# Altium footprint library 16-PCBa Modl.PcbLib: 81 footprints (part 4 of 6)
Each footprint in its own frame and in the unit in brackets; x right, y up, seen from the top. Pads: shape width x height; smd on the part's side, far side on the other; paste and mask are expansions set on the pad; w line width, h text height; cw(c..) or ccw(c..) is an arc to the next point about the centre after c.
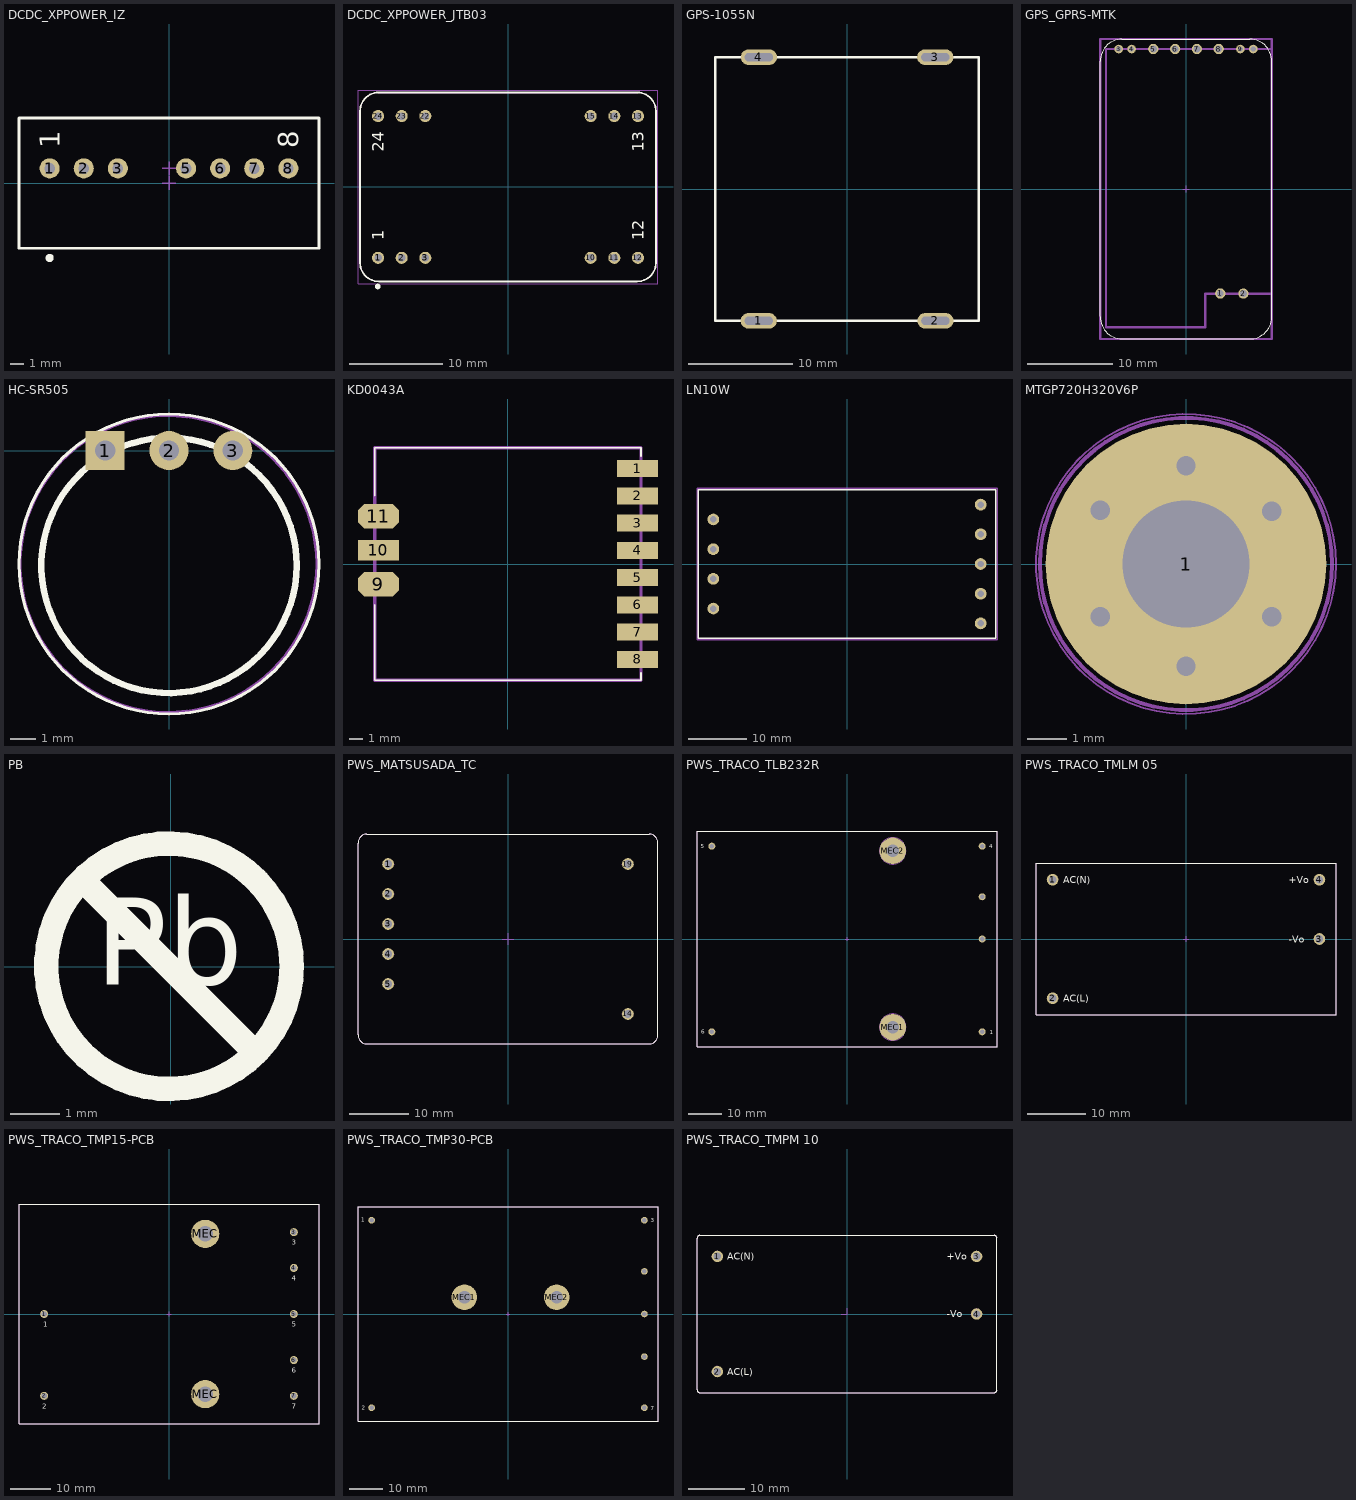
[diagram p3: the footprints below, top view; thin cyan lines are the x and y axes]

## DCDC_XPPOWER_IZ [mm] "SIP-8 Package DC-DC Converter,Body 21.85x11.1mm, IZ Serie"
height 11.6
pads (7):
  round 1.5 hole 0.8: 1(-8.89,1.1) 2(-6.35,1.1) 3(-3.81,1.1) 5(1.27,1.1) 6(3.81,1.1) 7(6.35,1.1) 8(8.89,1.1)
Top Overlay:
  circle w0.3: c-8.89,-5.567 r0.15
  lines w0.2: -11.175,-4.85 -11.175,4.85 11.175,4.85 11.175,-4.85 -11.175,-4.85
  text "8" at 9.64,2.6 h1.5
  text "1" at -8.14,2.6 h1.5
Mechanical 8:
  lines w0.1: -9.39,1.1 -8.89,1.1 ; -8.89,0.6 -8.89,1.1 ; -8.89,1.6 -8.89,1.1 ; -8.39,1.1 -8.89,1.1 ; -6.85,1.1 -6.35,1.1 ; -6.35,0.6 -6.35,1.1 ; -6.35,1.6 -6.35,1.1 ; -5.85,1.1 -6.35,1.1 ; -4.31,1.1 -3.81,1.1 ; -3.81,0.6 -3.81,1.1 ; -3.81,1.6 -3.81,1.1 ; -3.31,1.1 -3.81,1.1 ; -0.5,0 0,0 ; -0.5,1.1 0,1.1 ; 0,-0.5 0,0 ; 0,0.5 0,0 ; 0,0.6 0,1.1 ; 0,1.6 0,1.1 ; 0.5,0 0,0 ; 0.5,1.1 0,1.1 ; 0.77,1.1 1.27,1.1 ; 1.27,0.6 1.27,1.1 ; 1.27,1.6 1.27,1.1 ; 1.77,1.1 1.27,1.1 ; 3.31,1.1 3.81,1.1 ; 3.81,0.6 3.81,1.1 ; 3.81,1.6 3.81,1.1 ; 4.31,1.1 3.81,1.1 ; 5.85,1.1 6.35,1.1 ; 6.35,0.6 6.35,1.1 ; 6.35,1.6 6.35,1.1 ; 6.85,1.1 6.35,1.1 ; 8.39,1.1 8.89,1.1 ; 8.89,0.6 8.89,1.1 ; 8.89,1.6 8.89,1.1 ; 9.39,1.1 8.89,1.1
  text "2" at -5.6,2.6 h1.5
  text "3" at -3.06,2.6 h1.5
  text "5" at 2.02,2.6 h1.5
  text "6" at 4.56,2.6 h1.5
  text "7" at 7.1,2.6 h1.5
Mechanical 14:
  lines w0.1: -11.175,-4.85 11.175,-4.85 11.175,4.85 -11.175,4.85 -11.175,-4.85
  text "8" at 9.64,2.6 h1.5
  text "1" at -8.14,2.6 h1.5
3D body "DCDC_XPPOWER_IZ.stp": height 11.6, standoff -3.05, extent -11.175,-4.85 11.175,4.85

## DCDC_XPPOWER_JTB03 [mm] "JTB03 Series , Body 31.8x20.3mm, Pitch 2.54mm"
height 10.2
pads (12):
  round 1.3 hole 0.8: 1(-13.97,-7.62) 2(-11.43,-7.62) 3(-8.89,-7.62) 10(8.89,-7.62) 11(11.43,-7.62) 12(13.97,-7.62) 13(13.97,7.62) 14(11.43,7.62) 15(8.89,7.62) 22(-8.89,7.62) 23(-11.43,7.62) 24(-13.97,7.62)
Top Overlay:
  circle w0.3: c-14,-10.7 r0.15
  lines w0.2: -15.9,-8.15 ccw(c-13.9,-8.15) -13.9,-10.15 13.9,-10.15 ccw(c13.9,-8.15) 15.9,-8.15 15.9,8.15 ccw(c13.9,8.15) 13.9,10.15 -13.9,10.15 ccw(c-13.9,8.15) -15.9,8.15 -15.9,-8.15
  text "12" at 14.605,-5.715 h1.27
  text "24" at -13.335,3.81 h1.27
  text "13" at 14.605,3.81 h1.27
  text "1" at -13.335,-5.715 h1.27
Mechanical 14:
  lines w0.1: -15.9,-8.15 ccw(c-13.9,-8.15) -13.9,-10.15 ; -15.9,-8.15 ccw(c-13.9,-8.15) -13.9,-10.15 ; -15.9,-8.15 ccw(c-13.9,-8.15) -13.9,-10.15 ; -15.9,-8.15 -15.9,8.15 ; -15.9,-8.15 -15.9,8.15 ; -15.9,-8.15 -15.9,8.15 ; -15.9,8.15 cw(c-13.9,8.15) -13.9,10.15 ; -15.9,8.15 cw(c-13.9,8.15) -13.9,10.15 ; -15.9,8.15 cw(c-13.9,8.15) -13.9,10.15 ; -13.9,-10.15 13.9,-10.15 ; -13.9,-10.15 13.9,-10.15 ; -13.9,-10.15 13.9,-10.15 ; -13.9,10.15 13.9,10.15 ; -13.9,10.15 13.9,10.15 ; -13.9,10.15 13.9,10.15 ; 13.9,-10.15 ccw(c13.9,-8.15) 15.9,-8.15 ; 13.9,-10.15 ccw(c13.9,-8.15) 15.9,-8.15 ; 13.9,-10.15 ccw(c13.9,-8.15) 15.9,-8.15 ; 13.9,10.15 cw(c13.9,8.15) 15.9,8.15 ; 13.9,10.15 cw(c13.9,8.15) 15.9,8.15 ; 13.9,10.15 cw(c13.9,8.15) 15.9,8.15 ; 15.9,-8.15 15.9,8.15 ; 15.9,-8.15 15.9,8.15 ; 15.9,-8.15 15.9,8.15
  text "24" at -13.335,3.81 h1.27
  text "13" at 14.605,3.81 h1.27
  text "12" at 14.605,-5.715 h1.27
  text "1" at -13.335,-5.715 h1.27
Mechanical 15:
  lines w0.05: -16.125,-10.41 -16.125,10.41 16.125,10.41 16.125,-10.41 -16.125,-10.41
3D body "DCDC_XPPOWER_JTB03.stp": height 10.2, standoff -3.8, extent -15.9,-10.15 15.9,10.15

## GPS-1055N [mm]
height 10.2
pads (4):
  oval 3.5x1.5 hole 0.8 slot 2.7 at 0 deg: 1(-8.5,-12.7) 2(8.518,-12.7) 3(8.509,12.7) 4(-8.491,12.7)
Top Overlay:
  lines w0.254: -12.7,-12.7 12.7,-12.7 12.7,12.7 -12.7,12.7 -12.7,-12.7
3D body "1055-n.stp": height 7.28, standoff -2, extent -15.225,-15.075 12.725,12.725

## GPS_GPRS-MTK [mm]
height 10.2
pads (10):
  round 1.2 hole 0.8: 1(4,-12.192) 2(6.7,-12.201) 5(-3.81,16.332) 6(-1.27,16.332) 7(1.27,16.332) 8(3.81,16.332)
  round 1 hole 0.6: 3(-7.85,16.332) 4(-6.35,16.332) 9(6.35,16.332) 10(7.85,16.332)
Top Overlay:
  lines w0.1: -10.008,-14.884 ccw(c-7.429,-14.922) -7.468,-17.501 7.391,-17.501 ccw(c7.429,-14.922) 10.008,-14.961 ; -10.008,-14.859 -10.008,14.884 cw(c-7.429,14.922) -7.468,17.501 7.458,17.501 cw(c7.42,14.922) 9.998,14.884 ; 10,-14.994 10,14.884
Mechanical 1:
  lines w0.1: -9.34,-16.126 2.25,-16.126 2.25,-12.227 9.982,-12.227 9.982,16.307 ; -9.34,16.332 9.982,16.332
Mechanical 13:
  lines w0.1: -0.381,0 0.381,0 ; 0,-0.381 0,0.381
Mechanical 14:
  lines w0.254: -9.329,-16.129 2.253,-16.129 2.253,-12.217 10,-12.217 10,16.332 -9.329,16.332 -9.329,-16.129
Mechanical 15:
  lines w0.1: 9.975,16.332 -9.329,16.332 -9.329,-16.129 2.253,-16.129 2.253,-12.217 10,-12.217
  lines w0.254: -10.008,-17.5 9.983,-17.5 10,-17.483 10,17.5 ; -10.008,17.5 10.008,17.5 ; -10,-17.5 -10,17.5
3D body "gps-gprs_mode.stp": height 3.9, standoff -1.32, extent -9.967,-17.6 10.033,17.55
3D body "krconn-mini-6.stp": height 2.16, standoff 0.8, extent -6.167,-16.353 7.133,-5.593

## HC-SR505 [mil]
height 401.57
pads (3):
  rect 60x60 hole 31.5: 1(-98.43,0)
  round 60 hole 31.5: 2(0,0) 3(98.43,0)
Top Overlay:
  circle w10: c0,-177.17 r196.85
  circle w5: c0,-175 r231.3
Mechanical 15:
  circle w5: c-1,-175 r229.05
3D body "hc-sr505.stp": height 1354.33, standoff -70.79, extent -231.78,-408.89 232,54.89

## KD0043A [mm]
height 10.2
pads (11):
  rect 3x1.254 smd: 1(9.5,7) 2(9.5,5) 3(9.5,3) 4(9.5,1) 5(9.5,-1) 6(9.5,-3) 7(9.5,-5) 8(9.5,-7)
  oct 3x1.8 smd: 9(-9.5,-1.5) 11(-9.5,3.5)
  rect 3x1.5 smd: 10(-9.5,1)
Top Overlay:
  lines w0.127: -9.779,-3 -9.779,-8.534 9.754,-8.534 9.754,-8 ; -9.779,5 -9.779,8.534 9.754,8.534 9.754,7.9
Mechanical 14:
  lines w0.254: -9.779,-8.534 9.754,-8.534 9.754,8.534 -9.779,8.534 -9.779,-8.534
Mechanical 15:
  lines w0.127: -9.779,-8.5 9.754,-8.5 9.754,8.5 -9.779,8.5 -9.779,-8.5
3D body "kd0043a.stp": height 1.8, standoff 0.03, extent -9.788,-8.534 9.611,8.484

## LN10W [mm]
height 10.2
pads (9):
  round 2 hole 1.1: 1/on/off(-22.86,-7.62) 2/sync(-22.86,-2.54) 3/-Vin(-22.86,2.54) 4/+Vin(-22.86,7.62) 5/+Vout(22.86,10.16) "6/No Pin"(22.86,5.08) 7/+Vout(22.86,0) 8/COM(22.86,-5.08) 9/-Vout(22.86,-10.16)
Top Overlay:
  lines w0.254: -25.4,-12.7 25.4,-12.7 25.4,12.7 -25.4,12.7 -25.4,-12.7
Mechanical 15:
  lines w0.254: -25.654,-12.954 25.654,-12.954 25.654,12.954 -25.654,12.954 -25.654,-12.954
3D body "ln10w.stp": height 10.07, standoff -3, extent -25.4,-12.7 25.4,12.7

## MTGP720H320V6P [mm]
pads (1):
  round 7.2 hole 3.25: 1(0,0)
via -2.2,-1.35 diameter 1 hole 0.5
via -2.2,1.375 diameter 1 hole 0.5
via 0,2.525 diameter 1 hole 0.5
via 2.2,1.35 diameter 1 hole 0.5
via 0,-2.625 diameter 1 hole 0.5
via 2.2,-1.35 diameter 1 hole 0.5
Mechanical 8:
  circle w0.1: c0,0 r2.6
  circle w0.1: c0,0 r3.75
  lines w0.1: -2.657,1.625 -2.224,1.375 ; -2.632,-1.6 -2.199,-1.35 ; -2.474,0.942 -2.224,1.375 ; -2.449,-0.917 -2.199,-1.35 ; -1.974,1.808 -2.224,1.375 ; -1.949,-1.783 -2.199,-1.35 ; -1.791,1.125 -2.224,1.375 ; -1.766,-1.1 -2.199,-1.35 ; -0.5,-2.625 0,-2.625 ; -0.5,0 0,0 ; -0.5,2.525 0,2.525 ; 0,-3.125 0,-2.625 ; 0,-2.125 0,-2.625 ; 0,-0.5 0,0 ; 0,0.5 0,0 ; 0,2.025 0,2.525 ; 0,3.025 0,2.525 ; 0.5,-2.625 0,-2.625 ; 0.5,0 0,0 ; 0.5,2.525 0,2.525 ; 1.766,-1.1 2.199,-1.35 ; 1.766,1.1 2.199,1.35 ; 1.949,-1.783 2.199,-1.35 ; 1.949,1.783 2.199,1.35 ; 2.449,-0.917 2.199,-1.35 ; 2.449,0.917 2.199,1.35 ; 2.632,-1.6 2.199,-1.35 ; 2.632,1.6 2.199,1.35
Mechanical 14:
  circle w0.1: c0,0 r3.75
Mechanical 15:
  circle w0.05: c0,0 r3.85
3D body "mtgp720h320v6p.stp": height 0.1, standoff -1.75, extent -3.627,-3.627 3.628,3.628

## PB [mm]
Top Overlay:
  circle w0.5: c-0.031,0.013 r2.5
  lines w0.5: -1.737,1.719 1.675,-1.693
  text "Pb" at -1.536,-0.948 h3.05
3D body "pb.stp": height 0.02, standoff 0, extent -2.725,-2.725 2.725,2.725

## PCBComponent_1 - duplicate [mm]

## PWS_MATSUSADA_TC [mm] "TC Serie, Body 50.8x35.5mm, High Voltage Power Supply"
height 16.2
pads (7):
  round 2 hole 1.3: 1(-20.3,12.7) 2(-20.3,7.62) 3(-20.3,2.54) 4(-20.3,-2.54) 5(-20.3,-7.62) 14(20.3,-12.7) 19(20.3,12.7)
Top Overlay:
  lines w0.2: -25.4,-16.25 ccw(c-23.9,-16.25) -23.9,-17.75 23.9,-17.75 ccw(c23.9,-16.25) 25.4,-16.25 25.4,16.25 ccw(c23.9,16.25) 23.9,17.75 -23.9,17.75 ccw(c-23.9,16.25) -25.4,16.25 -25.4,-16.25
Mechanical 8:
  lines w0.1: -21.3,-7.62 -20.3,-7.62 ; -21.3,-2.54 -20.3,-2.54 ; -21.3,2.54 -20.3,2.54 ; -21.3,7.62 -20.3,7.62 ; -21.3,12.7 -20.3,12.7 ; -20.3,-8.62 -20.3,-7.62 ; -20.3,-6.62 -20.3,-7.62 ; -20.3,-3.54 -20.3,-2.54 ; -20.3,-1.54 -20.3,-2.54 ; -20.3,1.54 -20.3,2.54 ; -20.3,3.54 -20.3,2.54 ; -20.3,6.62 -20.3,7.62 ; -20.3,8.62 -20.3,7.62 ; -20.3,11.7 -20.3,12.7 ; -20.3,13.7 -20.3,12.7 ; -19.3,-7.62 -20.3,-7.62 ; -19.3,-2.54 -20.3,-2.54 ; -19.3,2.54 -20.3,2.54 ; -19.3,7.62 -20.3,7.62 ; -19.3,12.7 -20.3,12.7 ; -1,0 0,0 ; 0,-1 0,0 ; 0,1 0,0 ; 1,0 0,0 ; 19.3,-12.7 20.3,-12.7 ; 19.3,12.7 20.3,12.7 ; 20.3,-13.7 20.3,-12.7 ; 20.3,-11.7 20.3,-12.7 ; 20.3,11.7 20.3,12.7 ; 20.3,13.7 20.3,12.7 ; 21.3,-12.7 20.3,-12.7 ; 21.3,12.7 20.3,12.7
Mechanical 14:
  lines w0.1: -25.4,-16.25 ccw(c-23.9,-16.25) -23.9,-17.75 23.9,-17.75 ccw(c23.9,-16.25) 25.4,-16.25 25.4,16.25 ccw(c23.9,16.25) 23.9,17.75 -23.9,17.75 ccw(c-23.9,16.25) -25.4,16.25 -25.4,-16.25
3D body "PWS_MATSUSADA_TC.stp": height 16.2, standoff -3.6, extent -25.4,-17.75 25.4,17.75

## PWS_TRACO_TLB232R [mm] "TLB Model For PCB Mount, Body 89x64mm"
height 40.5
pads (8):
  round 2.1 hole 1.4: 1(40.65,-27.9) 2(40.65,0) 3(40.65,12.7) 4(40.65,27.9) 5(-40.65,27.9) 6(-40.65,-27.9)
  round 8 hole 3.8: MEC1(13.75,-26.5) MEC2(13.75,26.5)
Top Overlay:
  lines w0.2: -45.1,-32.35 45.1,-32.35 45.1,32.35 -45.1,32.35 -45.1,-32.35
  text "1" at 42.93,-28.61 h1.2
  text "4" at 42.83,27.265 h1.2
  text "6" at -43.77,-28.48 h1.2
  text "5" at -43.97,27.31 h1.2
Mechanical 8:
  circle w0.1: c-40.65,27.9 r0.5
  circle w0.1: c-40.65,-27.9 r0.5
  circle w0.1: c13.75,-26.5 r1.5
  circle w0.1: c40.65,-27.9 r0.5
  circle w0.1: c40.65,0 r0.5
  circle w0.1: c40.65,12.7 r0.5
  circle w0.1: c40.65,27.9 r0.5
  circle w0.1: c13.75,-26.5 r4
  circle w0.1: c13.75,26.5 r1.5
  circle w0.1: c13.75,26.5 r4
  lines w0.1: -41.15,-27.9 -40.65,-27.9 ; -41.15,27.9 -40.65,27.9 ; -40.65,-28.4 -40.65,-27.9 ; -40.65,-27.4 -40.65,-27.9 ; -40.65,27.4 -40.65,27.9 ; -40.65,28.4 -40.65,27.9 ; -40.15,-27.9 -40.65,-27.9 ; -40.15,27.9 -40.65,27.9 ; -0.5,0 0,0 ; 0,-0.5 0,0 ; 0,0.5 0,0 ; 0.5,0 0,0 ; 13.25,-26.5 13.75,-26.5 ; 13.25,26.5 13.75,26.5 ; 13.75,-27 13.75,-26.5 ; 13.75,-26 13.75,-26.5 ; 13.75,26 13.75,26.5 ; 13.75,27 13.75,26.5 ; 14.25,-26.5 13.75,-26.5 ; 14.25,26.5 13.75,26.5 ; 40.15,-27.9 40.65,-27.9 ; 40.15,0 40.65,0 ; 40.15,12.7 40.65,12.7 ; 40.15,27.9 40.65,27.9 ; 40.65,-28.4 40.65,-27.9 ; 40.65,-27.4 40.65,-27.9 ; 40.65,-0.5 40.65,0 ; 40.65,0.5 40.65,0 ; 40.65,12.2 40.65,12.7 ; 40.65,13.2 40.65,12.7 ; 40.65,27.4 40.65,27.9 ; 40.65,28.4 40.65,27.9 ; 41.15,-27.9 40.65,-27.9 ; 41.15,0 40.65,0 ; 41.15,12.7 40.65,12.7 ; 41.15,27.9 40.65,27.9
Mechanical 14:
  lines w0.1: 45.1,-27.85 45.1,-32.35 ; 45.1,-32.35 45.1,32.35 -45.1,32.35 -45.1,-32.35 45.1,-32.35
  text "1" at 42.93,-28.61 h1.2
  text "4" at 42.83,27.265 h1.2
  text "6" at -43.77,-28.48 h1.2
  text "5" at -43.97,27.31 h1.2
3D body "PWS_TRACO_TLB232R.stp": height 40.25, standoff -6.3, extent -45.1,-32.35 45.1,32.35

## PWS_TRACO_TMLM 05 [mm] "TMLM 05 Series , Body 50.9x25.5mm, Power Supply"
height 15.66
pads (4):
  round 2 hole 1.3: 1(-22.86,10.16) 2(-22.86,-10.16) 3(22.86,0) 4(22.86,10.16)
Top Overlay:
  lines w0.2: -25.7,-13 25.7,-13 25.7,13 -25.7,13 -25.7,-13
  text "AC(N)" at -21.073,9.527 h1.2
  text "+Vo" at 17.585,9.55 h1.2
  text "-Vo" at 17.585,-0.61 h1.2
  text "AC(L)" at -21.073,-10.793 h1.2
Mechanical 8:
  lines w0.1: -23.36,-10.16 -22.86,-10.16 ; -23.36,10.16 -22.86,10.16 ; -22.86,-10.66 -22.86,-10.16 ; -22.86,-9.66 -22.86,-10.16 ; -22.86,9.66 -22.86,10.16 ; -22.86,10.66 -22.86,10.16 ; -22.36,-10.16 -22.86,-10.16 ; -22.36,10.16 -22.86,10.16 ; -0.5,0 0,0 ; 0,-0.5 0,0 ; 0,0.5 0,0 ; 0.5,0 0,0 ; 22.36,0 22.86,0 ; 22.36,10.16 22.86,10.16 ; 22.86,-0.5 22.86,0 ; 22.86,0.5 22.86,0 ; 22.86,9.66 22.86,10.16 ; 22.86,10.66 22.86,10.16 ; 23.36,0 22.86,0 ; 23.36,10.16 22.86,10.16
Mechanical 14:
  lines w0.1: -25.7,-13 25.7,-13 25.7,13 -25.7,13 -25.7,-13
  text "-Vo" at 17.585,-0.61 h1.2
  text "+Vo" at 17.585,9.55 h1.2
  text "AC(N)" at -21.073,9.527 h1.2
  text "AC(L)" at -21.073,-10.793 h1.2
3D body "PWS_TRACO_TMLM 05.stp": height 15.75, standoff -3.8, extent -25.7,-13 25.7,13

## PWS_TRACO_TMP15-PCB [mm] "TMP15 Model For PCB Mount, Body 74x54mm"
height 19.8
pads (9):
  round 2 hole 1.3: 1(-31,0) 2(-31,-20.32) 3(31,20.32) 4(31,11.43) 5(31,0) 6(31,-11.43) 7(31,-20.32)
  round 7 hole 3.8: MEC(9,-19.9) MEC(9,19.9)
Top Overlay:
  lines w0.2: -37.25,-27.25 37.25,-27.25 37.25,27.25 -37.25,27.25 -37.25,-27.25
  text "3" at 30.53,17.16 h1.27
  text "1" at -31.27,-3.16 h1.27
  text "2" at -31.47,-23.48 h1.27
  text "6" at 30.53,-14.59 h1.27
  text "7" at 30.53,-23.48 h1.27
  text "5" at 30.53,-3.16 h1.27
  text "4" at 30.53,8.27 h1.27
Mechanical 8:
  lines w0.1: -31.5,-20.32 -31,-20.32 ; -31.5,0 -31,0 ; -31,-20.82 -31,-20.32 ; -31,-19.82 -31,-20.32 ; -31,-0.5 -31,0 ; -31,0.5 -31,0 ; -30.5,-20.32 -31,-20.32 ; -30.5,0 -31,0 ; -0.5,0 0,0 ; 0,-0.5 0,0 ; 0,0.5 0,0 ; 0.5,0 0,0 ; 8.5,-19.9 9,-19.9 ; 8.5,19.9 9,19.9 ; 9,-20.4 9,-19.9 ; 9,-19.4 9,-19.9 ; 9,19.4 9,19.9 ; 9,20.4 9,19.9 ; 9.5,-19.9 9,-19.9 ; 9.5,19.9 9,19.9 ; 30.5,-20.32 31,-20.32 ; 30.5,-11.43 31,-11.43 ; 30.5,0 31,0 ; 30.5,11.43 31,11.43 ; 30.5,20.32 31,20.32 ; 31,-20.82 31,-20.32 ; 31,-19.82 31,-20.32 ; 31,-11.93 31,-11.43 ; 31,-10.93 31,-11.43 ; 31,-0.5 31,0 ; 31,0.5 31,0 ; 31,10.93 31,11.43 ; 31,11.93 31,11.43 ; 31,19.82 31,20.32 ; 31,20.82 31,20.32 ; 31.5,-20.32 31,-20.32 ; 31.5,-11.43 31,-11.43 ; 31.5,0 31,0 ; 31.5,11.43 31,11.43 ; 31.5,20.32 31,20.32
Mechanical 14:
  lines w0.1: -37.25,-27.25 37.25,-27.25 37.25,27.25 -37.25,27.25 -37.25,-27.25
  text "3" at 30.53,17.16 h1.27
  text "1" at -31.27,-3.16 h1.27
  text "2" at -31.47,-23.48 h1.27
  text "6" at 30.53,-14.59 h1.27
  text "7" at 30.53,-23.48 h1.27
  text "5" at 30.53,-3.16 h1.27
  text "4" at 30.53,8.27 h1.27
3D body "PWS_TRACO_TMP15-PCB.stp": height 19.85, standoff -4.3, extent -37.25,-27.25 37.25,27.25

## PWS_TRACO_TMP30-PCB [mm] "TPM  30W Model For PCB Mount, Body 88.9x63.5mm"
height 22
pads (9):
  round 2 hole 1.3: 1(-40.65,27.94) 2(-40.65,-27.94) 3(40.65,27.94) 4(40.65,12.7) 5(40.65,0) 6(40.65,-12.7) 7(40.65,-27.94)
  round 7.6 hole 3.8: MEC1(-13,5) MEC2(14.5,5)
Top Overlay:
  lines w0.2: -44.7,-32 -44.7,32 44.7,32 44.7,-32 -44.7,-32
  text "7" at 42.58,-28.71 h1.2
  text "1" at -43.72,27.46 h1.2
  text "2" at -43.52,-28.605 h1.2
  text "3" at 42.48,27.365 h1.2
Mechanical 8:
  lines w0.1: -41.15,-27.94 -40.65,-27.94 ; -41.15,27.94 -40.65,27.94 ; -40.65,-28.44 -40.65,-27.94 ; -40.65,-27.44 -40.65,-27.94 ; -40.65,27.44 -40.65,27.94 ; -40.65,28.44 -40.65,27.94 ; -40.15,-27.94 -40.65,-27.94 ; -40.15,27.94 -40.65,27.94 ; -13.5,5 -13,5 ; -13,4.5 -13,5 ; -13,5.5 -13,5 ; -12.5,5 -13,5 ; -0.5,0 0,0 ; 0,-0.5 0,0 ; 0,0.5 0,0 ; 0.5,0 0,0 ; 14,5 14.5,5 ; 14.5,4.5 14.5,5 ; 14.5,5.5 14.5,5 ; 15,5 14.5,5 ; 40.15,-27.94 40.65,-27.94 ; 40.15,-12.7 40.65,-12.7 ; 40.15,0 40.65,0 ; 40.15,12.7 40.65,12.7 ; 40.15,27.94 40.65,27.94 ; 40.65,-28.44 40.65,-27.94 ; 40.65,-27.44 40.65,-27.94 ; 40.65,-13.2 40.65,-12.7 ; 40.65,-12.2 40.65,-12.7 ; 40.65,-0.5 40.65,0 ; 40.65,0.5 40.65,0 ; 40.65,12.2 40.65,12.7 ; 40.65,13.2 40.65,12.7 ; 40.65,27.44 40.65,27.94 ; 40.65,28.44 40.65,27.94 ; 41.15,-27.94 40.65,-27.94 ; 41.15,-12.7 40.65,-12.7 ; 41.15,0 40.65,0 ; 41.15,12.7 40.65,12.7 ; 41.15,27.94 40.65,27.94
Mechanical 14:
  lines w0.1: -44.7,-32 -44.7,32 44.7,32 44.7,-32 -44.7,-32
  text "7" at 42.58,-28.71 h1.2
  text "1" at -43.72,27.46 h1.2
  text "2" at -43.52,-28.605 h1.2
  text "3" at 42.48,27.365 h1.2
3D body "PWS_TRACO_TMP30-PCB.stp": height 22, standoff -3.6, extent -44.7,-32 44.7,32

## PWS_TRACO_TMPM 10 [mm] "TMPM 10 Series, Body 52.4x27.2mm, Power Supply"
height 24
pads (4):
  round 2 hole 1.3: 1(-22.86,10.16) 2(-22.86,-10.16) 3(22.86,10.16) 4(22.86,0)
Top Overlay:
  lines w0.2: -26.45,-13.35 ccw(c-25.95,-13.35) -25.95,-13.85 25.95,-13.85 ccw(c25.95,-13.35) 26.45,-13.35 26.45,13.35 ccw(c25.95,13.35) 25.95,13.85 -25.95,13.85 ccw(c-25.95,13.35) -26.45,13.35 -26.45,-13.35
  text "AC(N)" at -21.073,9.527 h1.2
  text "+Vo" at 17.585,9.55 h1.2
  text "-Vo" at 17.585,-0.61 h1.2
  text "AC(L)" at -21.073,-10.793 h1.2
Mechanical 8:
  lines w0.2: -23.86,-10.16 -22.86,-10.16 -22.86,-9.16 ; -23.86,10.16 -22.86,10.16 -22.86,11.16 ; -1,0 0,0 0,1 ; 21.86,0 22.86,0 22.86,1 ; 21.86,10.16 22.86,10.16 22.86,11.16
  text "3" at 24.765,9.525 h1.2
  text "4" at 24.765,-0.635 h1.2
  text "2" at -25.4,-10.795 h1.2
  text "1" at -25.4,9.527 h1.2
Mechanical 14:
  lines w0.1: -26.45,-13.35 ccw(c-25.95,-13.35) -25.95,-13.85 25.95,-13.85 ccw(c25.95,-13.35) 26.45,-13.35 26.45,13.35 ccw(c25.95,13.35) 25.95,13.85 -25.95,13.85 ccw(c-25.95,13.35) -26.45,13.35 -26.45,-13.35
  text "-Vo" at 17.585,-0.61 h1.2
  text "+Vo" at 17.585,9.55 h1.2
  text "AC(N)" at -21.073,9.527 h1.2
  text "AC(L)" at -21.073,-10.793 h1.2
3D body "PWS_TRACO_TMPM 10.stp": height 24, standoff -3.1, extent -26.45,-13.85 26.45,13.85